# Altium footprint library Miscellaneous Devices.PcbLib: 277 footprints (part 6 of 18)
Each footprint in its own frame and in the unit in brackets; x right, y up, seen from the top. Pads: shape width x height; smd on the part's side, far side on the other; paste and mask are expansions set on the pad; w line width, h text height; cw(c..) or ccw(c..) is an arc to the next point about the centre after c.
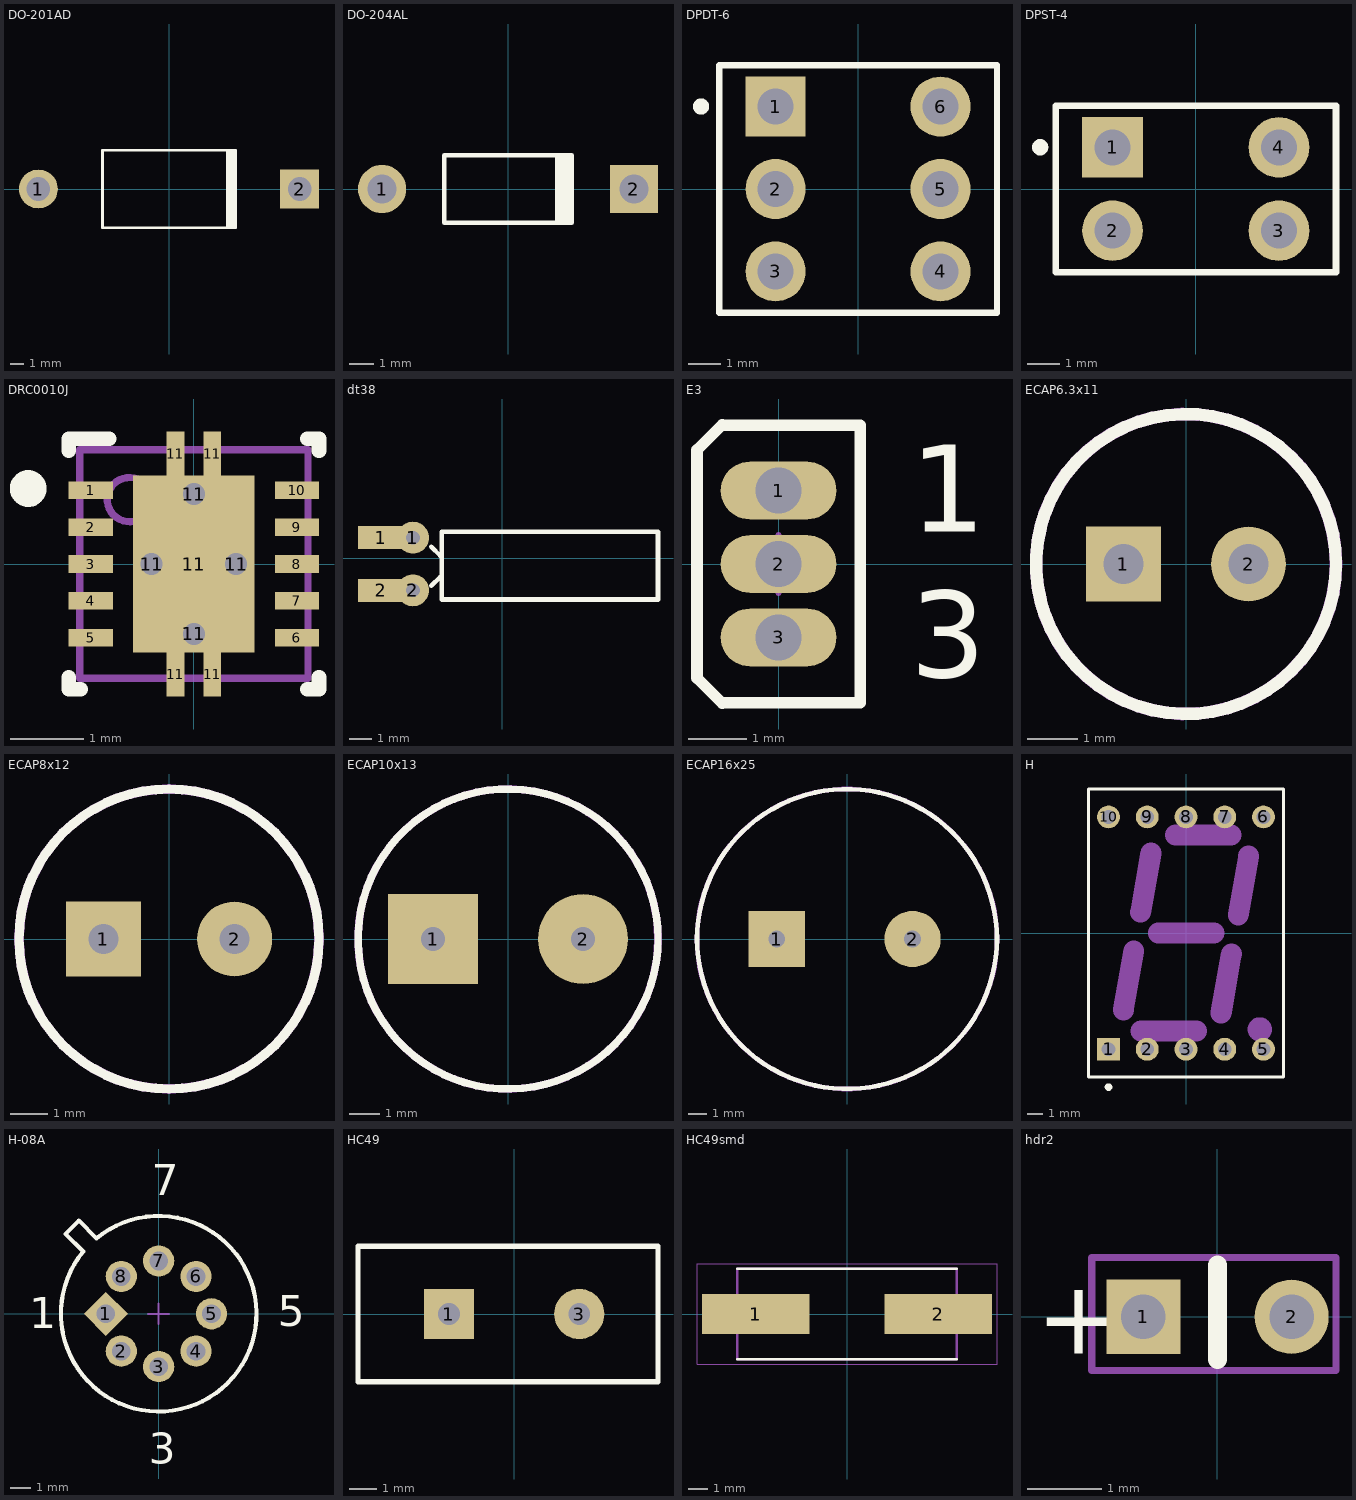
[diagram p5: the footprints below, top view; thin cyan lines are the x and y axes]

## DO-201AD [mm] "Diode, Axial; Body 9.5 x 5.6 mm (LxDia. max), Lead Dia. 1.32 mm (max)"
height 5.6
pads (2):
  round 2.8 hole 1.7: 1(-9.42,0)
  rect 2.8x2.8 hole 1.7: 2(9.42,0)
Top Overlay:
  rectangle: 4.1,-2.8 4.9,2.8
  lines w0.2: 4.8,-2.8 -4.8,-2.8 -4.8,2.8 4.8,2.8

## DO-204AL [mm] "Diode, Axial; Body 5.2 x 2.7 mm (LxDia. max), Lead Dia. 0.86 mm (max)"
height 2.7
pads (2):
  round 2 hole 1.2: 1(-5.23,0)
  rect 2x2 hole 1.2: 2(5.23,0)
Top Overlay:
  rectangle: 1.95,-1.4 2.75,1.4
  lines w0.2: 2.65,-1.4 -2.65,-1.4 -2.65,1.4 2.65,1.4

## DPDT-6 [mm] "Switch; 6 Leads"
pads (6):
  rect 1.85x1.85 hole 1.1: 1(-2.54,2.54)
  round 1.85 hole 1.1: 2(-2.54,0) 3(-2.54,-2.54) 4(2.54,-2.54) 5(2.54,0) 6(2.54,2.54)
Top Overlay:
  circle w0.25: c-4.836,2.541 r0.125
  lines w0.2: -4.28,-3.81 4.28,-3.81 4.28,3.81 -4.28,3.81 -4.28,-3.81

## DPST-4 [mm] "Switch; 4 Leads"
pads (4):
  rect 1.85x1.85 hole 1.1: 1(-2.54,1.27)
  round 1.85 hole 1.1: 2(-2.54,-1.27) 3(2.54,-1.27) 4(2.54,1.27)
Top Overlay:
  circle w0.25: c-4.751,1.274 r0.125
  lines w0.2: -4.28,-2.54 -4.28,2.54 4.28,2.54 4.28,-2.54 -4.28,-2.54

## DRC0010J [mm]
pads (19):
  rect 0.6x0.24 smd paste+0 mask+0.051: 1(-1.4,1) 2(-1.4,0.5) 3(-1.4,0) 4(-1.4,-0.5) 5(-1.4,-1) 6(1.4,-1) 7(1.4,-0.5) 8(1.4,0) 9(1.4,0.5) 10(1.4,1)
  round 0.5 hole 0.3 mask+0.051: 11(-0.575,0) 11(0,-0.95) 11(0,0.95) 11(0.575,0)
  rect 0.24x0.6 smd paste+0 mask+0.051: 11(-0.25,-1.5) 11(-0.25,1.5) 11(0.25,-1.5) 11(0.25,1.5)
  rect 1.65x2.4 smd paste-1.187 mask+0.051: 11(0,0)
Top Overlay:
  circle w0.25: c-2.25,1.025 r0.125
  lines w0.2: -1.7,-1.54 -1.7,-1.7 -1.54,-1.7 ; -1.7,1.54 -1.7,1.7 -1.15,1.7 ; 1.54,-1.7 1.7,-1.7 1.7,-1.54 ; 1.54,1.7 1.7,1.7 1.7,1.54
Top Paste:
  region: -0.75,-0.1 -0.75,-1.16 0.75,-1.16 0.75,-0.1
  region: -0.75,1.16 -0.75,0.1 0.75,0.1 0.75,1.16
Mechanical 13:
  circle w0.1: c-0.875,0.875 r0.3
  lines w0.1: -1.55,-1.55 -1.55,1.55 1.55,1.55 1.55,-1.55 -1.55,-1.55

## dt38 [mm] "quartz"
height 1.524
pads (4):
  rect 2x1 smd: 1(-5.3,0.9) 2(-5.3,-1.4)
  round 1.4 hole 0.6: 1(-3.9,0.9) 2(-3.9,-1.4)
Top Overlay:
  lines w0.2: -3.1,-1.2 -2.7,-0.8 ; -3.1,0.5 -2.7,0.1 -2.638,0.1 ; -2.64,-1.8 6.8,-1.8 6.8,1.162 -2.64,1.162 -2.64,-1.8
3D body "User Library-DT-38.STEP": height 3.5, standoff 0.05, extent -4.116,-1.8 6.9,1.2

## E3 [mm] "TO, Flat Index; 3 In-Line, Axial Leads; Body Dia. 4.6mm; Lead Dia. 0.5 mm (max)"
height 4.01
pads (3):
  oval 2x1 hole 0.8: 1(0,1.27) 2(0,0) 3(0,-1.27)
Top Overlay:
  lines w0.2: -0.97,-2.41 -1.41,-1.97 -1.41,1.97 -0.97,2.41 ; -0.97,-2.4 1.41,-2.4 1.41,2.4 -0.97,2.4
  text "1" at 2.275,0.555 h1.5
  text "3" at 2.275,-1.963 h1.5
Mechanical 15:
  lines w0.1: -0.5,0 0.5,0 ; 0,-0.5 0,0.5

## ECAP6.3x11 [mm] "Capacitor (Radial); 2 Leads"
height 11
pads (2):
  rect 1.5x1.5 hole 0.8: 1(-1.25,0)
  round 1.5 hole 0.8: 2(1.25,0)
Top Overlay:
  circle w0.25: c0,0 r3
Mechanical 15:
  circle w0.254: c0,0 r3
3D body "User Library-Cap-EL(6_3x11-2_5).STEP": height 11, standoff -3.2, extent -3.15,-3.149 3.152,3.149

## ECAP8x12 [mm] "Capacitor (Radial); 2 Leads"
height 12
pads (2):
  rect 2x2 hole 0.8: 1(-1.75,0)
  round 2 hole 0.8: 2(1.75,0)
Top Overlay:
  circle w0.25: c0,0 r4
Mechanical 15:
  circle w0.254: c0,0 r4
3D body "CircuitWorks-ELECTROLITIC CAPACITOR RADIAL 8X12.step": height 12, standoff -2.5, extent -4,-4 4,4

## ECAP10x13 [mm] "Capacitor (Radial); 2 Leads"
height 13
pads (2):
  rect 3x3 hole 0.8: 1(-2.5,0)
  round 3 hole 0.8: 2(2.5,0)
Top Overlay:
  circle w0.25: c0,0 r5
Mechanical 15:
  circle w0.254: c0,0 r5
3D body "User Library-Cap-EL(10x13-5).STEP": height 13, standoff -3.3, extent -5,-4.897 5.002,5.098

## ECAP16x25 [mm] "Capacitor (Radial); 2 Leads"
height 25
pads (2):
  rect 3x3 hole 0.9: 1(-3.75,0)
  round 3 hole 0.9: 2(3.5,0)
Top Overlay:
  circle w0.25: c0,0 r8
Mechanical 15:
  circle w0.254: c0,0 r8.004
3D body "User Library-CE_R300_D650_H1000.STEP": height 26.2, standoff -2.7, extent -8.25,-8.25 8.25,8.25

## H [mm] "LED, 7-Segment Display, 14.2 mm, RHD; 10 Leads; Row Space 15.24 mm; Pitch 2.54 mm"
height 8.25
pads (10):
  rect 1.5x1.5 hole 0.9: 1(-5.08,-7.62)
  round 1.5 hole 0.9: 2(-2.54,-7.62) 3(0,-7.62) 4(2.54,-7.62) 5(5.08,-7.62) 6(5.08,7.62) 7(2.54,7.62) 8(0,7.62) 9(-2.54,7.62) 10(-5.08,7.62)
Top Overlay:
  circle w0.25: c-5.08,-10.1 r0.125
  lines w0.2: -6.4,-9.45 -6.4,9.45 6.4,9.45 6.4,-9.45 -6.4,-9.45
Mechanical 1:
  circle w1: c4.842,-6.316 r0.296
  lines w1.37: -4.108,-5.054 -3.425,-1.17 ; -2.974,1.368 -2.293,5.255 ; -2.958,-6.429 0.692,-6.426 ; -1.821,0 1.828,0 ; -0.689,6.425 2.96,6.425 ; 2.295,-5.256 2.98,-1.371 ; 3.427,1.169 4.11,5.058
Mechanical 13:
  lines w0.1: -6.4,-9.45 6.4,-9.45 6.4,9.45 -6.4,9.45 -6.4,-9.45
3D body: height 8.25, standoff 0, extent -6.4,-9.45 6.4,9.45

## H-08A [mm] "Can; 8 Leads; Pin Circle Dia. 5.08 mm; Lead Dia. 0.53 mm (max)"
height 4.7
pads (8):
  rect 1.5x1.5 hole 0.9 rot 45: 1(-2.54,0)
  round 1.5 hole 0.9: 2(-1.796,-1.796) 3(0,-2.54) 4(1.796,-1.796) 5(2.54,0) 6(1.796,1.796) 7(0,2.54) 8(-1.796,1.796)
Top Overlay:
  lines w0.2: -4.475,3.838 -3.838,4.475 -2.99,3.626 cw(c0,0) -3.626,2.99 -4.475,3.838
  text "1" at -6.22,-0.696 h1.5
  text "3" at -0.469,-7.22 h1.5
  text "5" at 5.712,-0.589 h1.5
  text "7" at -0.332,5.7 h1.5
Mechanical 15:
  lines w0.1: -0.5,0 0.5,0 ; 0,-0.5 0,0.5

## HC49 [mm] "Qartz"
pads (2):
  rect 1.85x1.85 hole 0.8: 1(-2.4,0)
  round 1.85 hole 0.8: 3(2.4,0)
Top Overlay:
  lines w0.2: -5.75,-2.5 -5.75,2.5 5.3,2.5 5.3,-2.5 -5.75,-2.5
3D body "User Library-HC49U.STEP": height 13.49, standoff -1.97, extent -5.811,-2.35 5.361,2.322

## HC49smd [mm] "HC49 smd"
height 4.2
pads (2):
  rect 5.6x2.1 smd: 1(-4.75,0) 2(4.75,0)
Top Overlay:
  lines w0.127: -5.7,-2.35 5.7,-2.35 ; -5.7,2.35 5.7,2.35
Mechanical 13:
  lines w0.127: -5.7,-2.35 5.7,-2.35 5.7,2.35 -5.7,2.35 -5.7,-2.35
Mechanical 15:
  lines w0.05: -7.8,-2.6 7.8,-2.6 7.8,2.6 -7.8,2.6 -7.8,-2.6
3D body "User Library-HC49-SMD.STEP": height 5.1, standoff 0, extent -7.4,-2.25 7.6,2.25

## hdr2 [mm] "hdr2"
pads (2):
  rect 1x1 hole 0.6: 1(-1,0)
  round 1 hole 0.6: 2(1,0)
Top Overlay:
  lines w0.254: 0,-0.575 0,0.7
  text "+" at -2.45,-0.5 h1
Mechanical 15:
  lines w0.1: -1.7,-0.725 1.6,-0.725 1.6,0.8 -1.7,0.8 -1.7,-0.725